# Altium footprint library ComplexCurcuit.PcbLib: 36 footprints (part 2 of 3)
Each footprint in its own frame and in the unit in brackets; x right, y up, seen from the top. Pads: shape width x height; smd on the part's side, far side on the other; paste and mask are expansions set on the pad; w line width, h text height; cw(c..) or ccw(c..) is an arc to the next point about the centre after c.
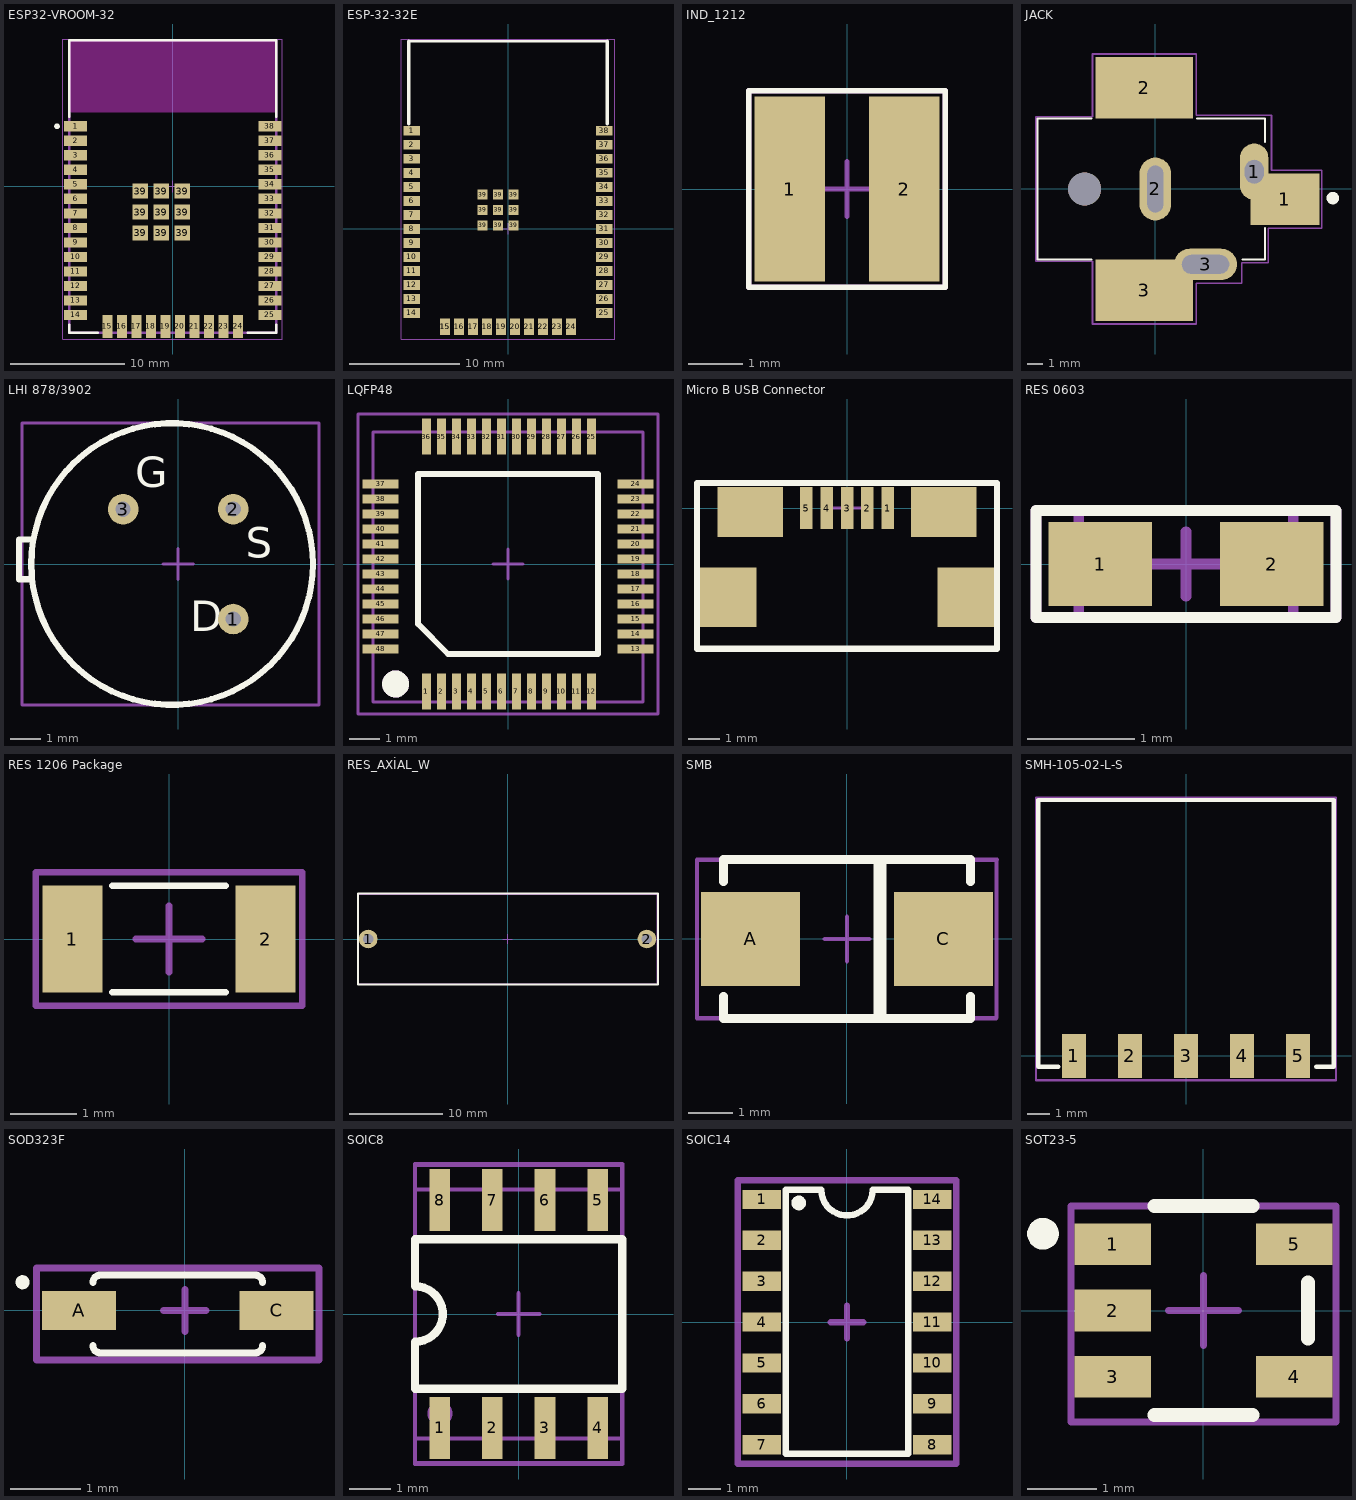
[diagram p1: the footprints below, top view; thin cyan lines are the x and y axes]

## ESP32-VROOM-32 [mm]
pads (47):
  rect 2x0.9 smd paste+0 mask+0: 1(-8.5,5.26) 2(-8.5,3.99) 3(-8.5,2.72) 4(-8.5,1.45) 5(-8.5,0.18) 6(-8.5,-1.09) 7(-8.5,-2.36) 8(-8.5,-3.63) 9(-8.5,-4.9) 10(-8.5,-6.17) 11(-8.5,-7.44) 12(-8.5,-8.71) 13(-8.5,-9.98) 14(-8.5,-11.25) 25(8.5,-11.25) 26(8.5,-9.98) 27(8.5,-8.71) 28(8.5,-7.44) 29(8.5,-6.17) 30(8.5,-4.9) 31(8.5,-3.63) 32(8.5,-2.36) 33(8.5,-1.09) 34(8.5,0.18) 35(8.5,1.45) 36(8.5,2.72) 37(8.5,3.99) 38(8.5,5.26)
  rect 0.9x2 smd paste+0 mask+0: 15(-5.715,-12.25) 16(-4.445,-12.25) 17(-3.175,-12.25) 18(-1.905,-12.25) 19(-0.635,-12.25) 20(0.635,-12.25) 21(1.905,-12.25) 22(3.175,-12.25) 23(4.445,-12.25) 24(5.715,-12.25)
  rect 1.33x1.33 smd paste+0 mask+0: 39(-2.835,-4.075) 39(-2.835,-2.24) 39(-2.835,-0.405) 39(-1,-4.075) 39(-1,-2.24) 39(-1,-0.405) 39(0.835,-4.075) 39(0.835,-2.24) 39(0.835,-0.405)
Top Overlay:
  circle w0.25: c-10.125,5.26 r0.125
  lines w0.2: -9.05,-12.075 -9.05,-12.8 -6.54,-12.8 ; -9.05,6.085 -9.05,12.8 9.05,12.8 9.05,6.085 ; 6.54,-12.8 9.05,-12.8 9.05,-12.075
Keep-Out Layer:
  rectangle: -9,6.45 9,12.75
  rectangle: -9,6.45 9,12.75
Top 3D Body:
  lines w0.2: -9.05,-12.8 9.05,-12.8 9.05,12.8 -9.05,12.8 -9.05,-12.8
Top Component Center:
  lines w0.1: -0.5,0 0.5,0 ; 0,-0.5 0,0.5 ; -9.6,-13.35 9.6,-13.35 ; -9.6,-13.35 9.6,-13.35 ; -9.6,-13.35 -9.6,12.9 ; -9.6,-13.35 -9.6,12.9 ; -9.6,12.9 9.6,12.9 ; -9.6,12.9 9.6,12.9 ; 9.6,-13.35 9.6,12.9 ; 9.6,-13.35 9.6,12.9
Top Designator:
  lines w0.1: -9.6,-13.35 -9.6,12.9 ; -9.6,-13.35 9.6,-13.35 ; -9.6,-13.35 -9.6,12.9 ; -9.6,-13.35 9.6,-13.35 ; -9.6,12.9 9.6,12.9 ; -9.6,12.9 9.6,12.9 ; 9.6,-13.35 9.6,12.9 ; 9.6,-13.35 9.6,12.9
  text ".Designator" at 0,-0.037 h1
3D body "UNK_Espressif_Systems_ESP32-WROOM-32_eec.STEP": height 0.25, standoff 0, extent -9.6,-13.35 9.6,12.9

## ESP-32-32E [mm]
pads (48):
  rect 1.5x0.9 smd mask+0.05: 1(-8.742,8.879) 2(-8.742,7.609) 3(-8.742,6.339) 4(-8.742,5.069) 5(-8.742,3.799) 6(-8.742,2.529) 7(-8.742,1.259) 8(-8.742,-0.011) 9(-8.742,-1.281) 10(-8.742,-2.551) 11(-8.742,-3.821) 12(-8.742,-5.091) 13(-8.742,-6.361) 14(-8.742,-7.631) 25(8.742,-7.629) 26(8.742,-6.359) 27(8.742,-5.089) 28(8.742,-3.819) 29(8.742,-2.549) 30(8.742,-1.279) 31(8.742,-0.009) 32(8.742,1.261) 33(8.742,2.531) 34(8.742,3.801) 35(8.742,5.071) 36(8.742,6.341) 37(8.742,7.611) 38(8.742,8.881)
  rect 0.9x1.5 smd mask+0.05: 15(-5.712,-8.881) 15(-5.712,-8.881) 16(-4.442,-8.881) 17(-3.172,-8.881) 18(-1.902,-8.881) 19(-0.632,-8.881) 20(0.638,-8.881) 21(1.908,-8.881) 22(3.178,-8.881) 23(4.448,-8.881) 24(5.718,-8.881)
  rect 0.9x0.9 smd mask+0.05: 39(-2.3,0.3) 39(-2.3,1.7) 39(-2.3,3.1) 39(-0.9,0.3) 39(-0.9,1.7) 39(-0.9,3.1) 39(0.5,0.3) 39(0.5,1.7) 39(0.5,3.1)
Top Overlay:
  lines w0.2: -9,17 9,17
  lines w0.3: -9,9.5 -9,17 ; 9,9.5 9,17
Top Component Center:
  lines w0.1: -0.5,0 0.5,0 ; 0,-0.5 0,0.5 ; -9.7,-10 9.7,-10 9.7,17.2 -9.7,17.2 -9.7,-10
Top Designator:
  lines w0.1: -9.7,-10 -9.7,17.2 9.7,17.2 9.7,-10 -9.7,-10
  text ".Designator" at -3.3,6.133 h1
3D body "ESP-32 .step": height 2.61, standoff -0.1, extent -8.95,-9 8.95,16.4

## IND_1212 [mm]
pads (2):
  rect 1.3x3.4 smd mask+0.05: 1(-1.05,0) 2(1.05,0)
Top Overlay:
  lines w0.1: -1.8,-1.8 1.8,-1.8 1.8,1.8 -1.8,1.8 -1.8,-1.8
Top Component Center:
  lines w0.1: -0.5,0 0.5,0 ; 0,-0.5 0,0.5 ; -1.8,-1.8 -1.8,1.8 1.8,1.8 1.8,-1.8 -1.8,-1.8
Top Designator:
  lines w0.1: -1.8,-1.8 1.8,-1.8 1.8,1.8 -1.8,1.8 -1.8,-1.8
  text ".Designator" at -1.1,-0.733 h0.5
3D body "78438335010_Download_STP_WE-MAIA-3015_rev1.stp": height 1.3, standoff 0.1, extent -1.5,-1.5 1.5,1.5

## JACK [mm] "PJ-037AH-SMT-TR"
pads (7):
  oval 1.8x3.6 hole 1.2 slot 1.5 at 90 deg: 1(6.3,1.1)
  rect 4.4x3.3 smd: 1(8.25,-0.65)
  rect 6.2x3.9 smd: 2(-0.7,6.45) 3(-0.7,-6.45)
  oval 2x4 hole 1 slot 3 at 90 deg: 2(0,0)
  oval 4x2 hole 1.2 slot 3 at 0 deg: 3(3.2,-4.8)
  round 2.1 hole 2.1 unplated: ""(-4.5,0)
Top Overlay:
  circle w0.4: c11.31,-0.58 r0.2
  lines w0.127: -4.05,-4.5 -7.5,-4.5 -7.5,4.5 -4.05,4.5 ; 2.65,4.5 7,4.5 7,3 ; 5.55,-4.5 7,-4.5 7,-2.5
Top Component Center:
  lines w0.1: -0.5,0 0.5,0 ; 0,-0.5 0,0.5 ; -7.6,-4.6 -4,-4.6 -4,-8.6 2.6,-8.6 2.6,-6 5.5,-6 5.5,-4.7 7.2,-4.7 7.2,-2.5 10.6,-2.5 10.6,1.2 7.4,1.2 7.4,4.7 2.6,4.7 2.6,8.6 -4,8.6 -4,4.6 -7.6,4.6 -7.6,-4.6
Top Designator:
  lines w0.1: -7.6,-4.6 -7.6,4.6 -4,4.6 -4,8.6 2.6,8.6 2.6,4.7 7.4,4.7 7.4,1.2 10.6,1.2 10.6,-2.5 7.2,-2.5 7.2,-4.7 5.5,-4.7 5.5,-6 2.6,-6 2.6,-8.6 -4,-8.6 -4,-4.6 -7.6,-4.6
  text ".Designator" at -4.1,-3.033 h0.8
3D body "CUI_DEVICES_PJ-037AH-SMT-TR.step": height 11.2, standoff -3.2, extent -7.6,-7.7 9.5,7.5

## LHI 878/3902 [mm] "Pyro Dec- LHI 878/3902"
pads (3):
  round 1 hole 0.5 mask+0.05: 1(1.797,-1.798) 2(1.797,1.794) 3(-1.8,1.79)
Top Overlay:
  circle w0.2: c-0.2,0 r4.6
  lines w0.2: -4.8,-0.5 -5.2,-0.5 -5.2,0.8 -4.8,0.8
  text "D" at 0.4,-2.2 h1
  text "S" at 2.2,0.2 h1
  text "G" at -1.4,2.5 h1
Top Component Center:
  lines w0.1: -0.5,0 0.5,0 ; 0,-0.5 0,0.5 ; -5.1,-4.6 4.6,-4.6 4.6,4.6 -5.1,4.6 -5.1,-4.6
Top Designator:
  lines w0.1: -5.1,-4.6 -5.1,4.6 4.6,4.6 4.6,-4.6 -5.1,-4.6
  text ".Designator" at -3.7,-1.367 h1
3D body "User Library-LHI878-1.step": height 4.8, standoff -4.6, extent -5.081,-4.599 4.6,4.599

## LQFP48 [mm] "7mm x 7mm"
pads (49):
  rect 0.3x1.2 smd mask+0.05: 1(-2.725,-4.25) 1(-2.725,-4.25) 2(-2.225,-4.25) 3(-1.725,-4.25) 4(-1.225,-4.25) 5(-0.725,-4.25) 6(-0.225,-4.25) 7(0.275,-4.25) 8(0.775,-4.25) 9(1.275,-4.25) 10(1.775,-4.25) 11(2.275,-4.25) 12(2.775,-4.25) 25(2.775,4.25) 26(2.275,4.25) 27(1.775,4.25) 28(1.275,4.25) 29(0.775,4.25) 30(0.275,4.25) 31(-0.225,4.25) 32(-0.725,4.25) 33(-1.225,4.25) 34(-1.725,4.25) 35(-2.225,4.25) 36(-2.725,4.25)
  rect 1.2x0.3 smd mask+0.05: 13(4.25,-2.828) 14(4.25,-2.328) 15(4.25,-1.828) 16(4.25,-1.328) 17(4.25,-0.828) 18(4.25,-0.328) 19(4.25,0.172) 20(4.25,0.672) 21(4.25,1.172) 22(4.25,1.672) 23(4.25,2.172) 24(4.25,2.672) 37(-4.25,2.672) 38(-4.25,2.172) 39(-4.25,1.672) 40(-4.25,1.172) 41(-4.25,0.672) 42(-4.25,0.172) 43(-4.25,-0.328) 44(-4.25,-0.828) 45(-4.25,-1.328) 46(-4.25,-1.828) 47(-4.25,-2.328) 48(-4.25,-2.828)
Top Overlay:
  circle w0.5: c-3.75,-4 r0.2
  lines w0.2: -3,-2 -2,-3 3,-3 3,3 -3,3 -3,-2
Top 3D Body:
  circle w0.5: c-3.75,-4 r0.2
  lines w0.1: -4.5,-4.6 4.5,-4.6 4.5,4.4 -4.5,4.4 -4.5,-4.6
Top Component Center:
  lines w0.1: -0.5,0 0.5,0 ; 0,-0.5 0,0.5 ; -5,-5 -5,5 5,5 5,-5 -5,-5
Top Designator:
  lines w0.1: -5,-5 -5.003,-5 ; -5.003,-5 5,-5 5,5 -5.003,5 -5.003,-5
  text ".Designator" at -1.898,-0.133 h1
3D body "STM32F103C6T6ATR.STEP": height 1.6, standoff 0, extent -4.5,-4.6 4.5,4.4

## Micro B USB Connector [mm]
pads (9):
  rect 0.4x1.35 smd mask+0.05: 1(1.3,0) 2(0.65,0) 3(0,0) 4(-0.65,0) 5(-1.3,0)
  rect 1.8x1.9 smd mask+0.05: ""(-3.8,-2.85) ""(3.8,-2.85)
  rect 2.1x1.6 smd mask+0.05: ""(-3.1,-0.13) ""(3.1,-0.13)
Top Overlay:
  lines w0.2: -4.8,-4.5 -4.8,-3.8 -4.8,0.8 4.8,0.8 4.8,-4.5 2,-4.5 1,-4.5 -1,-4.5 -2,-4.5 -4.8,-4.5
Top Component Center:
  lines w0.1: -0.5,0 0.5,0 ; 0,-0.5 0,0.5 ; -4.8,-4.5 4.8,-4.5 4.8,0.8 -4.8,0.8 -4.8,-4.5
Top Designator:
  lines w0.1: -4.8,-4.5 -4.8,0.8 4.8,0.8 4.8,-4.5 -4.8,-4.5
  text ".Designator" at -1.85,-2.683 h0.8
3D body "10118192C.stp": height 2.84, standoff -0.17, extent -3.956,-5.4 3.956,0.261

## RES 0603 [mil] "0603 Pack"
pads (2):
  rect 38x31 smd mask+1.97: 1(-31.5,0) 2(31.5,0)
Top Overlay:
  lines w3.94: -55.12,-19.68 -55.12,19.68 55.12,19.68 55.12,-19.68 -55.12,-19.68
Top 3D Body:
  lines w3.94: -39.37,-19.68 39.37,-19.68 39.37,19.68 -39.37,19.68 -39.37,-19.68
Top Component Center:
  lines w3.94: -11.81,0 11.81,0 ; 0,-11.81 0,11.81 ; -55.12,-19.68 55.12,-19.68 55.12,19.68 -55.12,19.68 -55.12,-19.68
Top Designator:
  lines w3.94: -55.12,-19.68 55.12,-19.68 55.12,19.68 -55.12,19.68 -55.12,-19.68
  text ".Designator" at -31.5,-5.25 h19.68
3D body "0603S1.STEP": height 16.89, standoff -0.83, extent -38.92,-18.88 38.92,19.68

## RES 1206 Package [mm]
pads (2):
  rect 0.9x1.6 smd mask+0.05: 1(-1.45,0) 2(1.45,0)
Top Overlay:
  lines w0.1: -0.85,-0.8 0.85,-0.8 ; -0.85,0.8 0.85,0.8
Top Component Center:
  lines w0.1: -0.5,0 0.5,0 ; 0,-0.5 0,0.5 ; -2,-1 -2,1 2,1 2,-1 -2,-1
Top Designator:
  lines w0.1: -2,-1 2,-1 2,1 -2,1 -2,-1
  text ".Designator" at -0.9,-0.233 h0.5
3D body "CAPC1206.STEP": height 1.3, standoff -0.01, extent -1.975,-0.976 1.975,0.976

## RES_AXİAL_W [mm]
pads (2):
  round 2 hole 1.1 mask+0.05: 1(-15,0) 2(15,0)
Top Overlay:
  lines w0.2: -16.1,-4.9 16.2,-4.9 16.2,4.9 -16.1,4.9 -16.1,-4.9
Top Component Center:
  lines w0.1: -0.5,0 0.5,0 ; 0,-0.5 0,0.5 ; -16,-4.8 16.1,-4.8 16.1,4.8 -11,4.8 -16,4.8 -16,-4.8
Top Designator:
  lines w0.1: -16,-4.8 -16,4.8 -11,4.8 16.1,4.8 16.1,-4.8 -16,-4.8
  text ".Designator" at -5.6,-2.067 h1
3D body: height 9.65, standoff 0, extent -11,-4.825 11,4.825
3D body: height 5.2, standoff 4.4, extent -15.2,-0.4 -6.2,0.4
3D body: height 5, standoff -4, extent -15.4,-0.4 -14.6,0.4
3D body: height 5.2, standoff 4.4, extent 6.188,-0.396 15.188,0.404
3D body: height 5, standoff -4, extent 14.588,-0.396 15.388,0.404

## SMB [mm]
pads (2):
  rect 2.25x2.12 smd mask+0.05: A(-2.185,0) C(2.185,0)
Top Overlay:
  rectangle: 0.6,-1.8 0.9,1.8
  lines w0.2: -2.8,-1.3 -2.8,-1.8 2.8,-1.8 2.8,-1.3 ; -2.8,1.3 -2.8,1.8 2.8,1.8 2.8,1.3
Top Component Center:
  lines w0.1: -0.5,0 0.5,0 ; 0,-0.5 0,0.5 ; -3.4,-1.8 -3.4,1.8 3.4,1.8 3.388,1.788 3.388,1.578 3.388,-1.788 3.377,-1.8 -3.4,-1.8
Top Designator:
  lines w0.1: -3.4,-1.8 -3.4,1.8 3.4,1.8 3.388,1.788 3.388,1.578 3.388,-1.788 3.377,-1.8 -3.4,-1.8
  text ".Designator" at -0.7,-0.733 h0.8
3D body "1SMB5919BT3G.STEP": height 2.54, standoff 0.07, extent -2.72,-1.78 2.72,1.78

## SMH-105-02-L-S [mm]
pads (5):
  rect 1.1x2 smd mask+0.05: 1(-5.08,0) 2(-2.54,0) 3(0,0) 4(2.54,0) 5(5.08,0)
Top Overlay:
  lines w0.2: -5.8,-0.5 -6.7,-0.5 -6.7,11.6 6.7,11.6 6.7,-0.5 5.9,-0.5
Top Component Center:
  lines w0.1: -0.5,0 0.5,0 ; 0,-0.5 0,0.5 ; -6.8,-1.1 -6.8,11.7 6.8,11.7 6.8,-1.1 -5.7,-1.1 -6.8,-1.1
Top Designator:
  lines w0.1: -6.8,-1.1 -5.7,-1.1 6.8,-1.1 6.8,11.7 -6.8,11.7 -6.8,-1.1
  text ".Designator" at -2.8,5.267 h0.8
3D body "SMH-105-02-L-S.stp": height 2.61, standoff 0.19, extent -6.604,-0.429 6.604,11.509

## SOD323F [mm]
pads (2):
  rect 1.05x0.55 smd mask+0.05: A(-1.5,0) C(1.3,0)
Top Overlay:
  circle w0.1: c-2.3,0.4 r0.05
  lines w0.1: -1.3,-0.5 ccw(c-1.2,-0.5) -1.2,-0.6 0.9,-0.6 1,-0.6 ccw(c1,-0.5) 1.1,-0.5 ; -1.3,0.4 cw(c-1.2,0.4) -1.2,0.5 -1.1,0.5 0.9,0.5 1,0.5 cw(c1,0.4) 1.1,0.4
Top Component Center:
  lines w0.1: -0.3,0 0.3,0 ; 0,-0.3 0,0.3 ; -2.1,-0.7 1.9,-0.7 1.9,0.6 -2.1,0.6 -2.1,0.3 -2.1,-0.7
Top Designator:
  lines w0.1: -2.1,-0.7 -2.1,0.3 -2.1,0.6 1.9,0.6 1.9,-0.7 -2.1,-0.7
  text ".Designator" at -0.5,-0.133 h0.5
3D body "1N4148WS.STEP": height 1, standoff 0, extent -1.35,-0.65 1.15,0.6

## SOIC8 [mm] "SOIC8 Package"
pads (8):
  rect 0.5x1.5 smd mask+0.05: 1(-1.905,-2.75) 2(-0.635,-2.75) 3(0.635,-2.75) 4(1.905,-2.75) 5(1.905,2.75) 6(0.635,2.75) 7(-0.635,2.75) 8(-1.905,2.75)
Top Overlay:
  lines w0.2: -2.5,-1.8 2.5,-1.8 2.5,-1.375 2.5,-1.325 2.5,-0.7 2.5,0.7 2.5,1.325 2.5,1.375 2.5,1.8 -2.5,1.8 -2.5,0.67 cw(c-2.5,0) -2.5,-0.67 -2.5,-1.8
Top 3D Body:
  circle w0.4: c-1.9,-2.4 r0.1
  lines w0.1: -2.5,-3 2.5,-3 2.5,3 -2.5,3 -2.5,-3
Top Component Center:
  lines w0.1: -0.5,0 0.5,0 ; 0,-0.5 0,0.5 ; -2.5,-3.619 -2.5,3.6 2.5,3.6 2.5,-3.619 -2.5,-3.619
Top Designator:
  lines w0.1: -2.5,-3.6 -2.5,3.619 2.5,3.619 2.5,-3.6 -2.5,-3.6
  text ".Designator" at -0.433,-0.7 h1
3D body "User Library-SOIC-8-1.step": height 1.75, standoff 0, extent -2.45,-3 2.45,3

## SOIC14 [mm]
pads (14):
  rect 1.2x0.6 smd mask+0.05: 1(-2.65,3.81) 2(-2.65,2.54) 3(-2.65,1.27) 4(-2.65,0) 5(-2.65,-1.27) 6(-2.65,-2.54) 7(-2.65,-3.81) 8(2.65,-3.81) 9(2.65,-2.54) 10(2.65,-1.27) 11(2.65,0) 12(2.65,1.27) 13(2.65,2.54) 14(2.65,3.81)
Top Overlay:
  circle w0.254: c-1.5,3.7 r0.1
  lines w0.2: -1.9,-4.09 -1.9,4.11 -0.8,4.11 ccw(c0,4.11) 0.8,4.11 1.9,4.11 1.9,-4.09 -1.9,-4.09
Top Component Center:
  lines w0.2: -0.5,0 0.5,0 ; 0,-0.5 0,0.5 ; -3.4,-4.4 3.4,-4.4 3.4,4.4 -3.4,4.4 -3.4,4.2 -3.4,-4.4
Top Designator:
  lines w0.2: -3.4,-4.4 -3.4,4.2 -3.4,4.4 3.4,4.4 3.4,-4.4 -3.4,-4.4
  text ".Designator" at -1.6,-1.367 h1
3D body "SOIC-14_NB_ONS.step": height 1.86, standoff 0.1, extent -3.099,-4.321 3.099,4.341

## SOT23-5 [mm]
pads (5):
  rect 1.1x0.6 smd mask+0.05: 1(-1.3,0.95) 2(-1.3,0) 3(-1.3,-0.95) 4(1.3,-0.95) 5(1.3,0.95)
Top Overlay:
  circle w0.254: c-2.3,1.1 r0.1
  lines w0.2: -0.7,-1.5 0.7,-1.5 ; -0.7,1.5 0.7,1.5 ; 1.5,-0.4 1.5,0.4
Top Component Center:
  lines w0.1: -0.5,0 0.5,0 ; 0,-0.5 0,0.5 ; -1.9,-1.6 -1.9,1.5 -1.4,1.5 1.9,1.5 1.9,-1.6 -1.9,-1.6
Top Designator:
  lines w0.1: -1.9,-1.6 1.9,-1.6 1.9,1.5 -1.4,1.5 -1.9,1.5 -1.9,-1.6
  text ".Designator" at -1.4,-0.533 h0.8
3D body "DBV0005A.stp": height 1.25, standoff 0.05, extent -1.4,-1.45 1.4,1.45